# Altium footprint library Inductance.PcbLib: 42 footprints (part 3 of 3)
Each footprint in its own frame and in the unit in brackets; x right, y up, seen from the top. Pads: shape width x height; smd on the part's side, far side on the other; paste and mask are expansions set on the pad; w line width, h text height; cw(c..) or ccw(c..) is an arc to the next point about the centre after c.
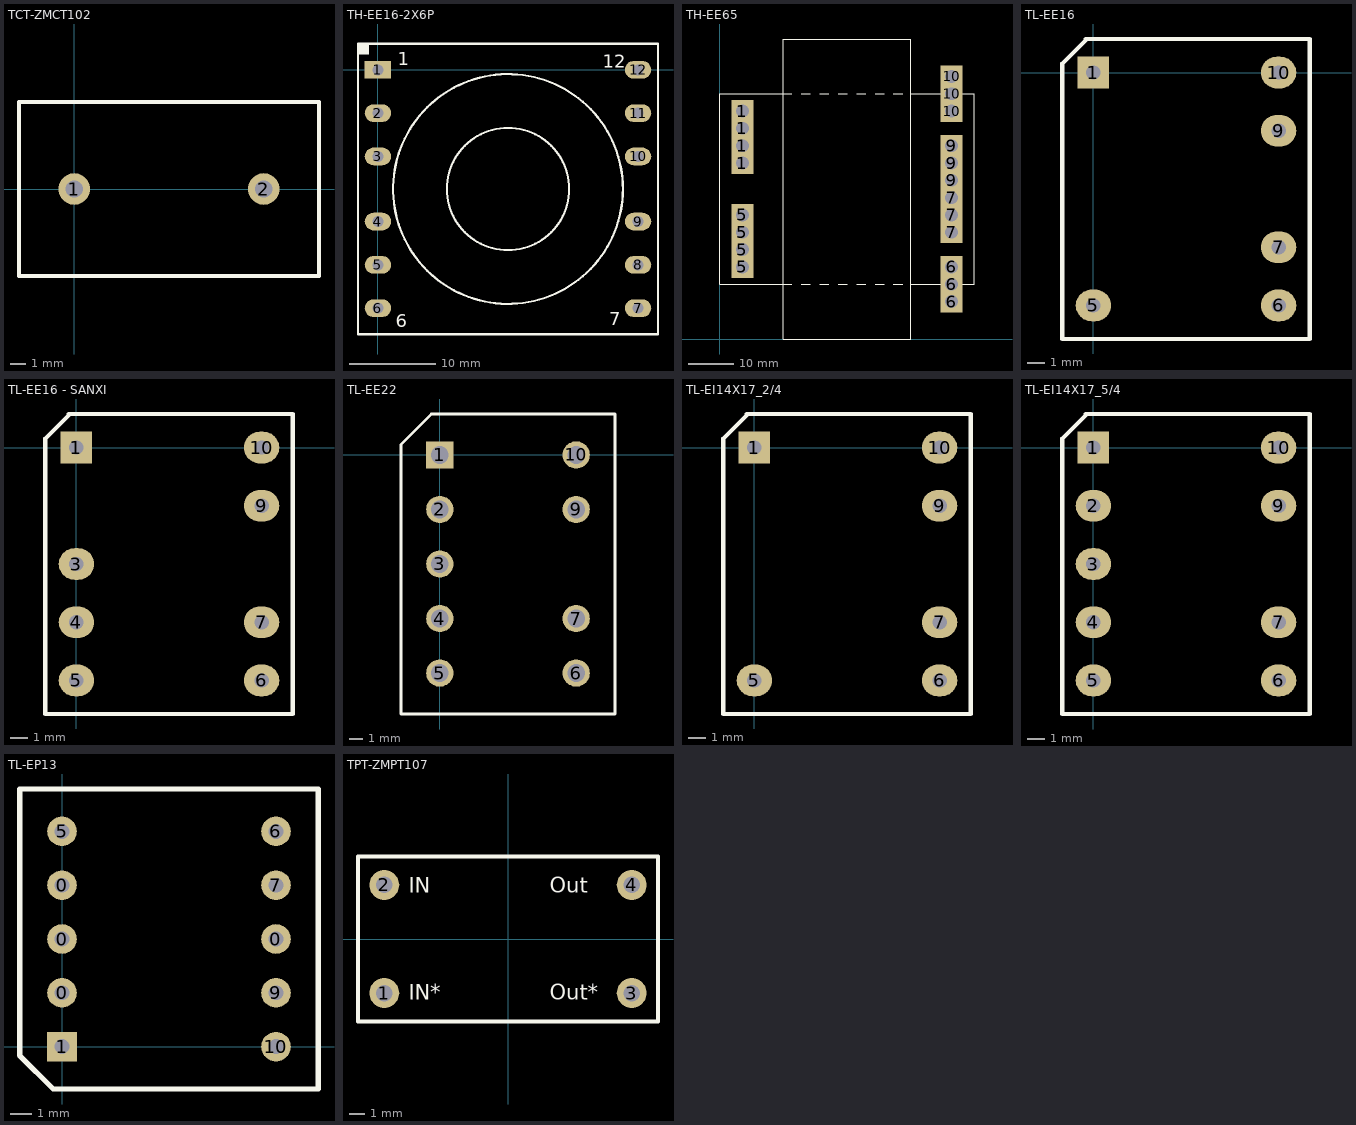
[diagram p2: the footprints below, top view; thin cyan lines are the x and y axes]

## TCT-ZMCT102 [mm]
pads (2):
  round 2 hole 1.1: 1(0,0) 2(12,0)
Top Overlay:
  lines w0.254: -3.5,-5.5 15.5,-5.5 15.5,5.5 -3.5,5.5 -3.5,-5.5
3D body: height 10.2, standoff 1, extent -3.125,-5.182 15.138,5.018
3D body: height 19.28, standoff 1.05, extent -3.125,-5.182 15.138,5.018
3D body: height 1, standoff -1, extent -0.299,-0.294 0.299,0.305
3D body: height 1, standoff -1, extent 11.709,-0.299 12.307,0.299
3D body: height 13.18, standoff 7.2, extent 2.972,-5.276 8.96,5.124

## TH-EE16-2X6P [mil]
pads (12):
  rect 120x80 hole 50: 1(0,0)
  oval 120x80 hole 50: 2(0,-196.85) 3(0,-393.7) 4(0,-688.98) 5(0,-885.83) 6(0,-1082.68) 7(1181.1,-1082.68) 8(1181.1,-885.83) 9(1181.1,-688.98) 10(1181.1,-393.7) 11(1181.1,-196.85) 12(1181.1,0)
Top Overlay:
  circle w10: c590.55,-541.34 r277.56
  circle w10: c590.55,-541.34 r521.65
  rectangle: -90.55,70 -40,118.11
  lines w10: -90.55,-1200.79 -90.55,118.11 1271.65,118.11 1271.65,-1200.79 -90.55,-1200.79
  text "1" at 90,20 h60
  text "12" at 1020,10 h60
  text "7" at 1050,-1160 h60
  text "6" at 80,-1170 h60
3D body: height 1043.31, standoff 255.91, extent 82,-1052 1101.59,-30.4
3D body: height 1299.21, standoff 0, extent 390,-121 786,115
3D body: height 1299.21, standoff 0, extent 389.5,-1198 785.5,-962
3D body: height 255.91, standoff 0, extent 390,-1197.5 785,117.5
3D body: height 1299.21, standoff 1043.31, extent 390.5,-1198 785.5,117
3D body: height 255.91, standoff 0, extent 787.5,-1200 1022.5,115
3D body: height 1299.21, standoff 0, extent 787.5,-121 1022.5,115
3D body: height 1299.21, standoff 0, extent 787.5,-1201 1022.5,-965
3D body: height 1299.21, standoff 1043.31, extent 787.5,-1200 1022.5,115
3D body: height 1299.21, standoff 1043.31, extent 155,-1197.5 390,117.5
3D body: height 1299.21, standoff 0, extent 155,-118.5 390,117.5
3D body: height 1299.21, standoff 0, extent 154.5,-1198 389.5,-962
3D body: height 255.91, standoff 0, extent 155.5,-1198 390.5,117
3D body: height 216.54, standoff 98.43, extent 1022.5,-1200 1267,115
3D body: height 216.54, standoff 98.43, extent -89.5,-1197.5 155,117.5
3D body: height 98.43, standoff -59.06, extent -19.21,-19.65 20,19.65
3D body: height 98.43, standoff -59.06, extent -19.61,-216.29 19.61,-177
3D body: height 98.43, standoff -59.06, extent -19.21,-413.65 20,-374.35
3D body: height 98.43, standoff -59.06, extent -19.21,-708.65 20,-669.35
3D body: height 98.43, standoff -59.06, extent -19.21,-905.65 20,-866.35
3D body: height 98.43, standoff -59.06, extent -19.61,-1102 19.61,-1062.71
3D body: height 98.43, standoff -59.06, extent 1161.79,-1102.65 1201,-1063.35
3D body: height 98.43, standoff -59.06, extent 1161.79,-905.65 1201,-866.35
3D body: height 98.43, standoff -59.06, extent 1161.79,-708.65 1201,-669.35
3D body: height 98.43, standoff -59.06, extent 1161.79,-413.65 1201,-374.35
3D body: height 98.43, standoff -59.06, extent 1161.79,-216.65 1201,-177.35
3D body: height 98.43, standoff -59.06, extent 1161.79,-19.65 1201,19.65

## TH-EE65 [mm]
pads (20):
  rect 4.8x4.8 hole 2.8: 1(5,38.715) 1(5,42.525) 1(5,46.335) 1(5,50.145) 5(5,15.855) 5(5,19.665) 5(5,23.475) 5(5,27.285) 6(51,8.235) 6(51,12.045) 6(51,15.855) 7(51,23.475) 7(51,27.285) 7(51,31.095) 9(51,34.905) 9(51,38.715) 9(51,42.525) 10(51,50.145) 10(51,53.955) 10(51,57.765)
Top Overlay:
  lines w0.254: 15.875,12 0,12 0,54 15.875,54 ; 17.907,12 19.939,12 ; 17.907,54 19.939,54 ; 21.971,12 24.003,12 ; 21.971,54 24.003,54 ; 26.035,12 28.067,12 ; 26.035,54 28.067,54 ; 30.099,12 32.131,12 ; 30.099,54 32.131,54 ; 34.163,12 36.195,12 ; 34.163,54 36.195,54 ; 38.227,12 40.259,12 ; 38.227,54 40.259,54 ; 42,12 56,12 56,54 42,54 ; 14,0 42,0 42,66 14,66 14,0
3D body "05.stp": height 65.7, standoff -4.7, extent 0.567,0.381 55.567,65.781

## TL-EE16 [mm]
height 11.6
pads (6):
  rect 1.8x1.8 hole 0.813: 1(0,0)
  oval 2x1.8 hole 0.813: 5(0,-13.2) 6(10.5,-13.2) 7(10.5,-9.9) 9(10.5,-3.3) 10(10.5,0)
Top Overlay:
  lines w0.254: -0.422,1.9 12.25,1.9 12.25,-15.1 -1.75,-15.1 -1.75,0.512 -0.362,1.9 0.086,1.9 -0.108,1.9
3D body: height 14, standoff 12, extent 3.736,-15.159 6.911,1.841
3D body: height 14, standoff 0, extent 3.736,0.703 6.911,1.833
3D body: height 14, standoff 0, extent 3.736,-15.159 6.911,-14.029
3D body: height 2, standoff 0, extent -1.824,-15.11 12.176,1.89
3D body: height 0, standoff -5, extent -0.455,-0.317 0.307,0.191
3D body: height 2, standoff -5, extent -0.455,-13.517 0.307,-13.009
3D body: height 0, standoff -5, extent 10.045,-13.517 10.807,-13.009
3D body: height 0, standoff -5, extent 10.045,-10.217 10.807,-9.709
3D body: height 0, standoff -5, extent 10.045,-3.617 10.807,-3.109
3D body: height 0, standoff -5, extent 10.045,-0.317 10.807,0.191
3D body: height 0, standoff -2, extent 3.736,-15.159 6.911,1.841
3D body: height 12, standoff 10, extent -1.778,-15.113 12.222,1.887
3D body: height 12, standoff 2, extent 1.323,-10.727 9.291,-2.743

## TL-EE16 - SANXI [mm]
height 11.6
pads (8):
  rect 1.8x1.8 hole 0.813: 1(0,0)
  oval 2x1.8 hole 0.813: 3(0,-6.6) 4(0,-9.9) 5(0,-13.2) 6(10.5,-13.2) 7(10.5,-9.9) 9(10.5,-3.3) 10(10.5,0)
Top Overlay:
  lines w0.254: -0.422,1.9 12.25,1.9 12.25,-15.1 -1.75,-15.1 -1.75,0.512 -0.362,1.9 0.086,1.9 -0.108,1.9
3D body: height 14, standoff 12, extent 3.81,-15.1 6.985,1.9
3D body: height 14, standoff 0, extent 3.81,0.762 6.985,1.892
3D body: height 14, standoff 0, extent 3.81,-15.1 6.985,-13.97
3D body: height 2, standoff 0, extent -1.75,-15.051 12.25,1.949
3D body: height 0, standoff -5, extent -0.381,-6.858 0.381,-6.35
3D body: height 0, standoff -5, extent -0.381,-0.258 0.381,0.25
3D body: height 0, standoff -5, extent -0.381,-10.158 0.381,-9.65
3D body: height 2, standoff -5, extent -0.381,-13.458 0.381,-12.95
3D body: height 0, standoff -5, extent 10.119,-13.458 10.881,-12.95
3D body: height 0, standoff -5, extent 10.119,-10.158 10.881,-9.65
3D body: height 0, standoff -5, extent 10.119,-3.558 10.881,-3.05
3D body: height 0, standoff -5, extent 10.119,-0.258 10.881,0.25
3D body: height 0, standoff -2, extent 3.81,-15.1 6.985,1.9
3D body: height 12, standoff 10, extent -1.704,-15.054 12.296,1.946
3D body: height 12, standoff 2, extent 1.397,-10.668 9.365,-2.684

## TL-EE22 [mm]
pads (9):
  rect 2x2 hole 1.3: 1(0,0)
  round 2 hole 1.3: 2(0,-4) 3(0,-8) 4(0,-12) 5(0,-16) 6(10,-16) 7(10,-12) 9(10,-4) 10(10,0)
Top Overlay:
  lines w0.2: -0.635,3 -0.635,2.977 -2.85,0.762 ; -2.85,0.762 -2.85,-19 12.85,-19 12.85,3 -0.612,3 -2.85,0.762
3D body "User Library-TR_EE22.STEP": height 20.81, standoff -3, extent -3.076,-17.63 12.954,2.39

## TL-EI14X17_2/4 [mm]
pads (6):
  rect 1.8x1.8 hole 0.813: 1(0,0)
  oval 2x1.8 hole 0.813: 5(0,-13.2) 6(10.5,-13.2) 7(10.5,-9.9) 9(10.5,-3.3) 10(10.5,0)
Top Overlay:
  lines w0.254: -0.422,1.9 12.25,1.9 12.25,-15.1 -1.75,-15.1 -1.75,0.512 -0.362,1.9 0.086,1.9 -0.108,1.9
3D body: height 12, standoff 4, extent 0.25,-11.67 10.211,-1.69
3D body: height 4, standoff 2, extent -1.448,-14.63 2.772,1.397
3D body: height 2, standoff -1.5, extent 10.191,-0.294 10.789,0.305
3D body: height 16, standoff 12, extent 2.757,-14.622 7.764,1.395
3D body: height 4, standoff 0, extent 2.765,-14.63 7.772,1.387
3D body: height 16, standoff 0, extent 2.762,-2.68 7.766,1.384
3D body: height 2, standoff -1.5, extent 10.197,-3.601 10.795,-3.003
3D body: height 2, standoff -1.5, extent 10.191,-10.2 10.789,-9.601
3D body: height 2, standoff -1.5, extent 10.197,-13.507 10.795,-12.909
3D body: height 2, standoff -1.5, extent -0.293,-13.507 0.305,-12.909
3D body: height 2, standoff -1.5, extent -0.305,-0.299 0.293,0.299
3D body: height 4, standoff 2, extent 7.747,-14.63 11.967,1.397
3D body: height 16, standoff 0, extent 2.769,-14.63 7.772,-10.566

## TL-EI14X17_5/4 [mm]
pads (9):
  rect 1.8x1.8 hole 0.813: 1(0,0)
  oval 2x1.8 hole 0.813: 2(0,-3.3) 3(0,-6.6) 4(0,-9.9) 5(0,-13.2) 6(10.5,-13.2) 7(10.5,-9.9) 9(10.5,-3.3) 10(10.5,0)
Top Overlay:
  lines w0.254: -0.422,1.9 12.25,1.9 12.25,-15.1 -1.75,-15.1 -1.75,0.512 -0.362,1.9 0.086,1.9 -0.108,1.9
3D body: height 2, standoff -1.5, extent -0.299,-10.2 0.299,-9.601
3D body: height 2, standoff -1.5, extent -0.299,-6.898 0.299,-6.299
3D body: height 2, standoff -1.5, extent -0.293,-3.601 0.305,-3.003
3D body: height 12, standoff 4, extent 0.276,-11.62 10.236,-1.639
3D body: height 4, standoff 2, extent -1.448,-14.63 2.772,1.397
3D body: height 2, standoff -1.5, extent 10.191,-0.294 10.789,0.305
3D body: height 16, standoff 12, extent 2.757,-14.622 7.764,1.395
3D body: height 4, standoff 0, extent 2.765,-14.63 7.772,1.387
3D body: height 16, standoff 0, extent 2.762,-2.68 7.766,1.384
3D body: height 2, standoff -1.5, extent 10.197,-3.601 10.795,-3.003
3D body: height 2, standoff -1.5, extent 10.191,-10.2 10.789,-9.601
3D body: height 2, standoff -1.5, extent 10.197,-13.507 10.795,-12.909
3D body: height 2, standoff -1.5, extent -0.293,-13.507 0.305,-12.909
3D body: height 2, standoff -1.5, extent -0.305,-0.299 0.293,0.299
3D body: height 4, standoff 2, extent 7.747,-14.63 11.967,1.397
3D body: height 16, standoff 0, extent 2.769,-14.63 7.772,-10.566

## TL-EP13 [mm]
pads (10):
  round 1.4 hole 0.7: 0(0,2.54) 0(0,5.08) 0(0,7.62) 0(10.1,5.08) 5(0,10.16) 6(10.1,10.16) 7(10.1,7.62) 9(10.1,2.54) 10(10.1,0)
  rect 1.4x1.4 hole 0.7: 1(0,0)
Top Overlay:
  lines w0.254: -2,-0.414 -2,12.16 12.1,12.16 12.1,-2 -0.414,-2 -2,-0.414
3D body "01.stp": height 12.3, standoff 0.3, extent -1.82,-1.905 11.98,11.895

## TPT-ZMPT107 [mm]
pads (4):
  round 2 hole 1.1: 1(-8.25,-3.6) 2(-8.25,3.6) 3(8.25,-3.6) 4(8.25,3.6)
Top Overlay:
  lines w0.254: -10,-5.5 -10,5.5 10,5.5 10,-5.5 -10,-5.5
  text "Out*" at 2.794,-4.064 h1.02
  text "Out" at 2.794,3.073 h1.02
  text "IN*" at -6.604,-4.064 h1.02
  text "IN" at -6.604,3.073 h1.02
3D body: height 19, standoff 1, extent -9.855,-5.359 9.855,5.359
3D body: height 1, standoff -1, extent -8.548,3.307 -7.95,3.906
3D body: height 1, standoff -1, extent -8.528,-3.886 -7.931,-3.287
3D body: height 1, standoff -1, extent 7.956,-3.901 8.554,-3.302
3D body: height 1, standoff -1, extent 7.962,3.307 8.56,3.906